# Altium footprint library Library.PcbLib: 292 footprints (part 9 of 20)
Each footprint in its own frame and in the unit in brackets; x right, y up, seen from the top. Pads: shape width x height; smd on the part's side, far side on the other; paste and mask are expansions set on the pad; w line width, h text height; cw(c..) or ccw(c..) is an arc to the next point about the centre after c.
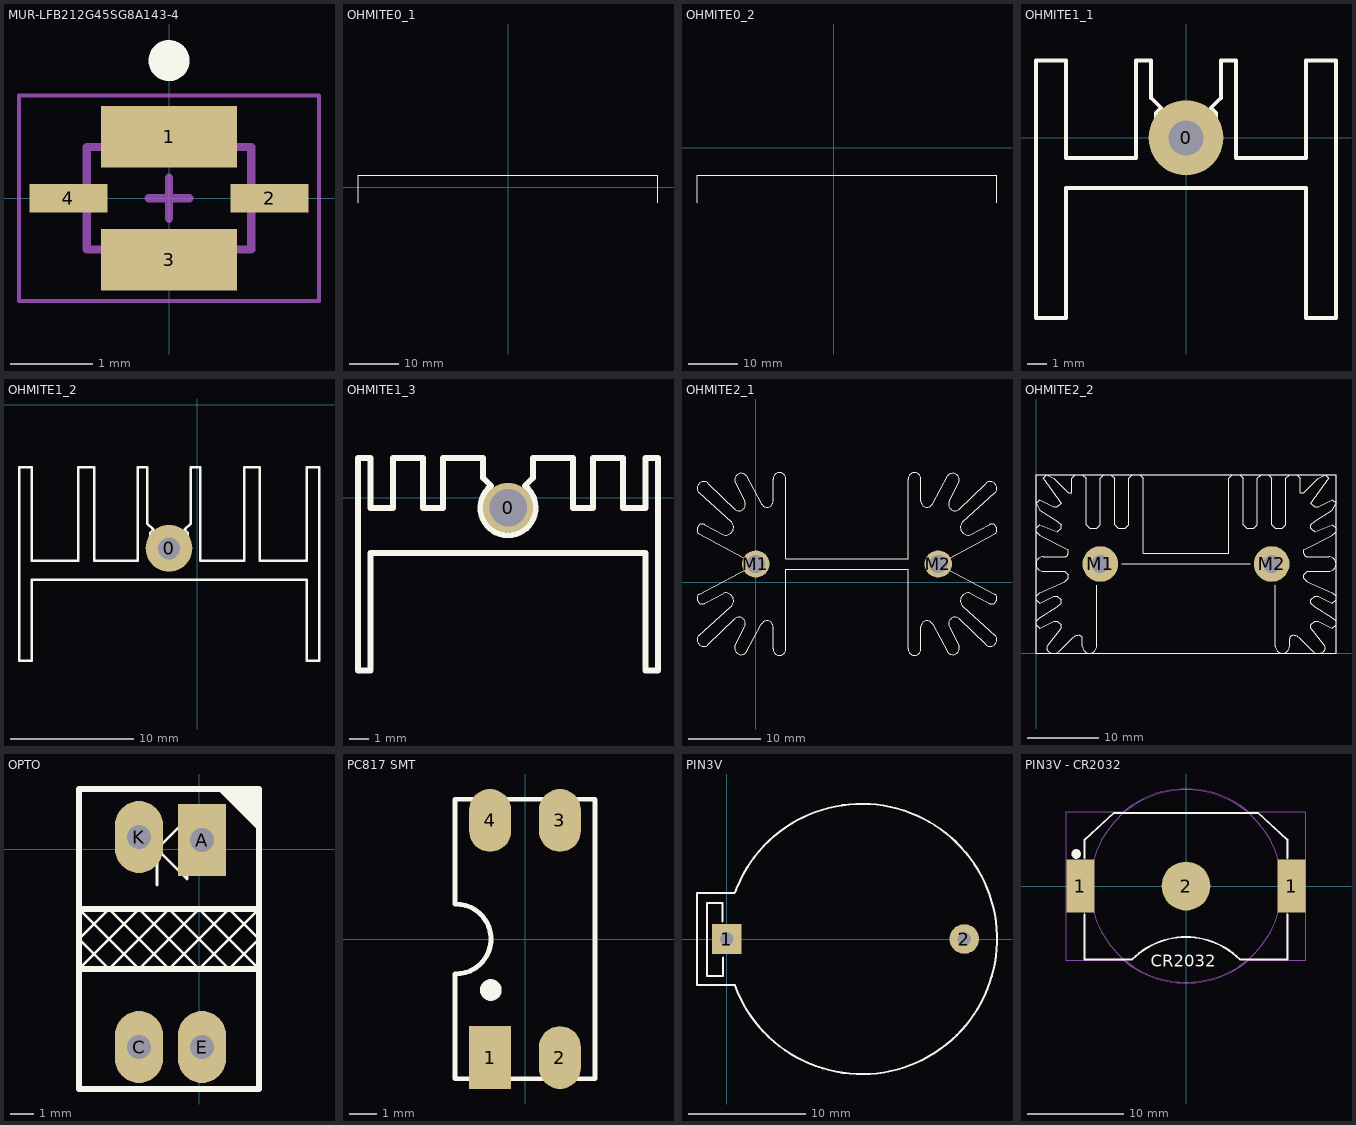
[diagram p8: the footprints below, top view; thin cyan lines are the x and y axes]

## MUR-LFB212G45SG8A143-4 [mm] "Hand Drawn, 4-Leads, Body 2x1.25mm"
height 0.95
pads (4):
  rect 1.65x0.75 smd: 1(0,0.75) 3(0,-0.75)
  rect 0.95x0.35 smd: 2(1.225,0) 4(-1.225,0)
Top Overlay:
  circle w0.25: c0,1.675 r0.125
Mechanical 13:
  lines w0.1: -1,-0.625 -1,0.625 1,0.625 1,-0.625 -1,-0.625
Mechanical 15:
  lines w0.05: -1.825,-1.25 -1.825,1.25 1.825,1.25 1.825,-1.25 -1.825,-1.25
  lines w0.1: -0.25,0 0.25,0 ; 0,-0.25 0,0.25
3D body: height 0.95, standoff 0, extent -1,-0.625 1,0.625

## OHMITE0_1 [mm] "HALF BRICK CONVERTER HEATSINK"
Top Overlay:
  lines w0.102: -30.599,-3.175 -30.599,2.413 30.401,2.413 30.401,-3.175
3D body: height 37, standoff 35, extent -30.754,2.159 30.246,22.225
3D body: height 32, standoff 30, extent -30.627,2.032 30.373,22.098
3D body: height 12, standoff 10, extent -30.627,2.032 30.373,22.098
3D body: height 17, standoff 15, extent -30.627,2.159 30.373,22.225
3D body: height 22, standoff 20, extent -30.627,2.159 30.373,22.225
3D body: height 27, standoff 25, extent -30.754,2.032 30.246,22.098
3D body: height 7, standoff 5, extent -30.627,2.159 30.373,22.225
3D body: height 37, standoff 0, extent -30.5,-3.175 30.5,2.311
3D body: height 2, standoff 0, extent -30.627,2.159 30.373,22.225

## OHMITE0_2 [mm] "HALF BRICK CONVERTER HEATSINK"
Top Overlay:
  lines w0.102: -27.805,-11.176 -27.805,-5.588 33.195,-5.588 33.195,-11.176
3D body: height 27, standoff 25, extent -27.96,-5.969 33.04,14.097
3D body: height 22, standoff 20, extent -27.833,-5.842 33.167,14.224
3D body: height 7, standoff 5, extent -27.833,-5.842 33.167,14.224
3D body: height 27, standoff 5, extent -27.706,-11.176 33.294,-5.69
3D body: height 17, standoff 15, extent -27.833,-5.842 33.167,14.224
3D body: height 12, standoff 10, extent -27.833,-5.969 33.167,14.097

## OHMITE0_3 [mm] "HALF BRICK CONVERTER HEATSINK"
3D body: height 7, standoff 5, extent -24.404,-8.382 6.096,11.684
3D body: height 22, standoff 5, extent -24.277,-13.716 6.223,-8.23
3D body: height 17, standoff 15, extent -24.404,-8.382 6.096,11.684
3D body: height 12, standoff 10, extent -24.404,-8.509 6.096,11.557
3D body: height 22, standoff 20, extent -24.404,-8.382 6.096,11.684

## OHMITE0_4 [mm] "HALF BRICK CONVERTER HEATSINK"
3D body: height 37, standoff 35, extent -29.992,-6.223 99.695,13.843
3D body: height 32, standoff 30, extent -29.865,-6.35 99.695,13.716
3D body: height 12, standoff 10, extent -29.865,-6.35 99.568,13.716
3D body: height 17, standoff 15, extent -29.865,-6.223 99.568,13.843
3D body: height 22, standoff 20, extent -29.865,-6.223 99.441,13.843
3D body: height 27, standoff 25, extent -29.992,-6.35 99.568,13.716
3D body: height 7, standoff 5, extent -29.865,-6.223 99.695,13.843
3D body: height 37, standoff 0, extent -29.845,-11.506 99.568,-6.02
3D body: height 2, standoff 0, extent -29.865,-6.223 99.568,13.843

## OHMITE0_5 [mm] "HALF BRICK CONVERTER HEATSINK"
3D body: height 37, standoff 35, extent -99.06,-6.223 99.695,13.843
3D body: height 32, standoff 30, extent -99.06,-6.35 99.695,13.716
3D body: height 12, standoff 10, extent -99.06,-6.35 99.568,13.716
3D body: height 17, standoff 15, extent -98.933,-6.223 99.568,13.843
3D body: height 22, standoff 20, extent -99.06,-6.223 99.441,13.843
3D body: height 27, standoff 25, extent -98.933,-6.35 99.568,13.716
3D body: height 7, standoff 5, extent -98.933,-6.223 99.695,13.843
3D body: height 37, standoff 0, extent -99.06,-11.506 99.568,-6.02
3D body: height 2, standoff 0, extent -99.06,-6.223 99.568,13.843

## OHMITE1_1 [mil]
pads (1):
  round 150 hole 70: 0(0,0)
Top Overlay:
  lines w7: -200,-100 199,-100
  lines w8: -300,-360 -300,155 -240,155 -240,-40 -100,-40 -100,155 -70,155 -70,80 -50,60 -60,50 -60,-20 -40,-40 40,-40 60,-20 60,50 50,60 70,80 70,155 100,155 100,-40 240,-40 240,155 300,155 300,-360 240,-360 240,-100 -240,-100 -240,-360 -300,-360
3D body "User Library-Disipador 34M8491-1.STEP": height 1000, standoff -122.05, extent -246,-156.97 250.06,98.97

## OHMITE1_2 [mil]
pads (1):
  round 150 hole 70: 0(-90,-460)
Top Overlay:
  lines w8: -570,-820 -570,-200 -530,-200 -530,-500 -380,-500 -380,-200 -330,-200 -330,-500 -190,-500 -190,-200 -160,-200 -160,-380 -140,-400 -150,-410 -150,-480 -130,-500 -50,-500 -30,-480 -30,-410 -40,-400 -20,-380 -20,-200 10,-200 10,-500 150,-500 150,-200 200,-200 200,-500 350,-500 350,-200 390,-200 390,-820 350,-820 350,-560 200,-560 150,-560 -330,-560 -380,-560 -530,-560 -530,-820 -570,-820
3D body "User Library-heat sink-1.STEP": height 1205.51, standoff 0, extent -538.79,-867 362.79,-221.33

## OHMITE1_3 [mil]
pads (1):
  round 100 hole 75: 0(440,-20)
Top Overlay:
  lines w12: 406,24 390,40 390,80 310,80 310,-20 270,-20 270,80 210,80 210,-20 165,-20 165,80 140,80 140,-345 165,-345 165,-110 715,-110 715,-345 740,-345 740,80 715,80 715,-20 670,-20 670,80 610,80 610,-20 570,-20 570,80 490,80 490,40 473.59,23.59 ; 406.37,23.52 ccw(c440,-20) 473.77,23.41
3D body "SW3dPS-heatsink TO126.STEP": height 984.25, standoff -149.61, extent 150.03,-322.25 731.97,103

## OHMITE2_1 [mm]
pads (2):
  round 3.81 hole 2.54 unplated: M1(0,2.54) M2(25.4,2.54)
Top Overlay:
  lines w0.152: -7.112,-2.921 -4.445,-1.524 cw(c-4.18,-2.584) -3.498,-3.437 -7.887,-7.353 ccw(c-7.239,-8.001) -6.591,-8.649 -2.921,-5.08 cw(c-2.334,-5.764) -1.55,-6.208 -2.898,-8.897 ccw(c-2.019,-9.157) -1.304,-9.729 0.799,-5.842 cw(c1.561,-6.223) 2.413,-6.223 2.413,-9.271 ccw(c3.302,-9.271) 4.191,-9.271 4.191,1.778 12.7,1.778 21.209,1.778 21.209,-9.271 ccw(c22.098,-9.271) 22.987,-9.271 22.987,-6.223 cw(c23.839,-6.223) 24.601,-5.842 26.704,-9.729 ccw(c27.419,-9.157) 28.298,-8.897 26.95,-6.208 cw(c27.734,-5.764) 28.321,-5.08 31.991,-8.649 ccw(c32.639,-8.001) 33.287,-7.353 28.898,-3.437 cw(c29.58,-2.584) 29.845,-1.524 32.512,-2.921 ; -7.112,8.001 -4.445,6.604 ccw(c-4.18,7.664) -3.498,8.517 -7.887,12.433 cw(c-7.239,13.081) -6.591,13.729 -2.921,10.16 ccw(c-2.334,10.844) -1.55,11.288 -2.898,13.977 cw(c-2.019,14.237) -1.304,14.809 0.799,10.922 ccw(c1.561,11.303) 2.413,11.303 2.413,14.351 cw(c3.302,14.351) 4.191,14.351 4.191,3.302 12.7,3.302 21.209,3.302 21.209,14.351 cw(c22.098,14.351) 22.987,14.351 22.987,11.303 ccw(c23.839,11.303) 24.601,10.922 26.704,14.809 cw(c27.419,14.237) 28.298,13.977 26.95,11.288 ccw(c27.734,10.844) 28.321,10.16 31.991,13.729 cw(c32.639,13.081) 33.287,12.433 28.898,8.517 ccw(c29.58,7.664) 29.845,6.604 32.512,8.001 ; -7.076,-2.942 cw(c-7.417,-2.261) -7.874,-1.651 0,2.54 -7.874,6.731 cw(c-7.417,7.341) -7.076,8.022 ; 32.476,-2.942 ccw(c32.817,-2.261) 33.274,-1.651 25.4,2.54 33.274,6.731 ccw(c32.817,7.341) 32.476,8.022
3D body: height 0.51, standoff -3.05, extent 24.13,1.27 26.66,3.805
3D body: height 0.51, standoff -3.05, extent -1.27,1.27 1.26,3.805
3D body: height 63.5, standoff 0, extent 4.191,1.778 21.209,3.302
3D body: height 63.5, standoff 0, extent -8.255,-10.16 4.191,2.54
3D body: height 63.5, standoff 0, extent -8.255,2.54 4.191,15.24
3D body: height 63.5, standoff 0, extent 21.209,2.54 33.655,15.24
3D body: height 63.5, standoff 0, extent 21.209,-10.16 33.655,2.54
3D body: height 0.51, standoff -3.05, extent 24.13,1.27 26.66,3.805

## OHMITE2_2 [mm]
pads (2):
  round 5 hole 2.5 unplated mask+0.051: M1(9,12.5) M2(33,12.5)
Top Overlay:
  drawing of 169 lines, arcs and shapes, not listed
Mechanical 1:
  lines w0.152: 0,0 0,25 42,25 42,0 0,0
3D body: height 0, standoff -3.05, extent 32.004,11.5 33.996,13.496
3D body: height 0, standoff -3.05, extent 8.004,11.5 9.996,13.496
3D body: height 25.4, standoff 0, extent 21,12.5 42,25
3D body: height 25.4, standoff 0, extent 33.5,0 42,12.5
3D body: height 25.4, standoff 0, extent 0,0 8.5,12.5
3D body: height 25.4, standoff 0, extent 0,12.5 21,25

## OPTO [mil] "Opto hinh chu U"
height 104.33
pads (4):
  rect 80x120 hole 40: A(5,15)
  oval 80x120 hole 40: C(-100,-330) E(5,-330) K(-100,20)
Top Overlay:
  region: 97.5,97.5 32.5,97.5 97.5,32.5
  lines w5: -200,-200 -150,-150 -100,-100 0,-200 30,-170 100,-100 100,-200 0,-100 -100,-200 -110,-190 -140,-160 -200,-100 ; -70,-60 -70,60 ; -20,-50 -20,50 ; -20,-50 -20,50 ; -20,-50 -70,0 -20,50 ; -200,-150 -170,-180 -150,-200 -50,-100 50,-200 100,-150 50,-100 -50,-200 -150,-100 -200,-150
  lines w10: -200,-200 100,-200 ; -200,-150 -200,-110 ; -200,-100 100,-100 ; 100,-150 100,-140 ; -200,-400 100,-400 100,100 -200,100 -200,-400
3D body "SW3dPS-ee-sx-1041.STEP": height 394.3, standoff -196.25, extent -166,-430.59 70.22,120.59

## PC817 SMT [mil]
pads (4):
  rect 60x90 smd: 1(-50,-169.69)
  oval 60x90 smd: 2(50,-169.69) 3(50,169.69) 4(-50,169.69)
Top Overlay:
  circle w15: c-49,-73 r8
  lines w7: -100.38,-49.95 ccw(c-98.69,0.02) -100,50 ; -100,-50 -100,-200 100,-200 100,200 -100,200 -100,51
3D body "User Library-PC817_Gullwing.STEP": height 151.57, standoff -0.06, extent -90.16,-196.85 90.16,196.85

## PCBComponent_1 - duplicate [mm]

## PIN3V [mil] "Socket PIN 3V"
pads (2):
  rect 100x100 hole 45: 1(0,0)
  round 100 hole 45: 2(800,0)
Top Overlay:
  lines w7: -14,59 -14,121 -66,121 -66,-124 -13,-124 -13,-63 ; 26.33,155 -100,155 -100,-155 27.93,-155 ; 27.6,156.07 cw(c455,0) 27.93,-156.97
3D body "batter2.STEP": height 278.16, standoff -137.2, extent -128.09,-446.83 1001.83,448.83

## PIN3V - CR2032 [mm] "CN-DIN, 3-Leads, Body 21.08x15.24mm"
height 4.57
pads (3):
  rect 2.9x5.5 smd: 1(-10.985,0) 1(10.985,0)
  round 5.08 smd: 2(0,0)
Top Overlay:
  circle w0.5: c-11.426,3.34 r0.25
  lines w0.2: -10.54,-2.94 -10.54,-7.62 -5.59,-7.62 cw(c0,-13.21) 5.591,-7.62 10.541,-7.62 ; -10.54,2.94 -10.54,4.83 -7.49,7.62 7.49,7.62 ; 7.49,7.621 10.54,4.83 10.54,2.94 ; 10.54,-7.62 10.54,-2.94
  text "CR2032" at -3.683,-8.382 h1.27
Mechanical 13:
  circle w0.1: c0,0 r10
  lines w0.1: 7.49,7.62 -7.49,7.62 -10.54,4.83 -10.54,2.94 -10.54,-2.94 -10.54,-7.62 -5.59,-7.62 cw(c0,-13.21) 5.591,-7.62 10.541,-7.62 ; 7.49,7.621 10.54,4.83 10.54,2.94 10.54,-2.94 10.54,-7.62
Mechanical 15:
  lines w0.05: -6.492,-7.737 ccw(c0,0) 6.492,-7.737 ; -6.492,7.72 -12.48,7.72 -12.48,-7.72 -6.477,-7.72 ; -6.492,7.738 cw(c0,0) 6.491,7.738 ; 6.477,-7.72 12.48,-7.72 12.48,7.72 6.491,7.72
  lines w0.1: -1,0 1,0 ; 0,-1 0,1
3D body: height 3.2, standoff 0, extent -10,-9.999 9.999,10
3D body "Linx 2032 Battery Holder.sldprt": height 4.4, standoff 0, extent -11.684,-7.688 11.816,7.366